# Altium footprint library Cty1.PcbLib: 870 footprints (part 47 of 55)
Each footprint in its own frame and in the unit in brackets; x right, y up, seen from the top. Pads: shape width x height; smd on the part's side, far side on the other; paste and mask are expansions set on the pad; w line width, h text height; cw(c..) or ccw(c..) is an arc to the next point about the centre after c.
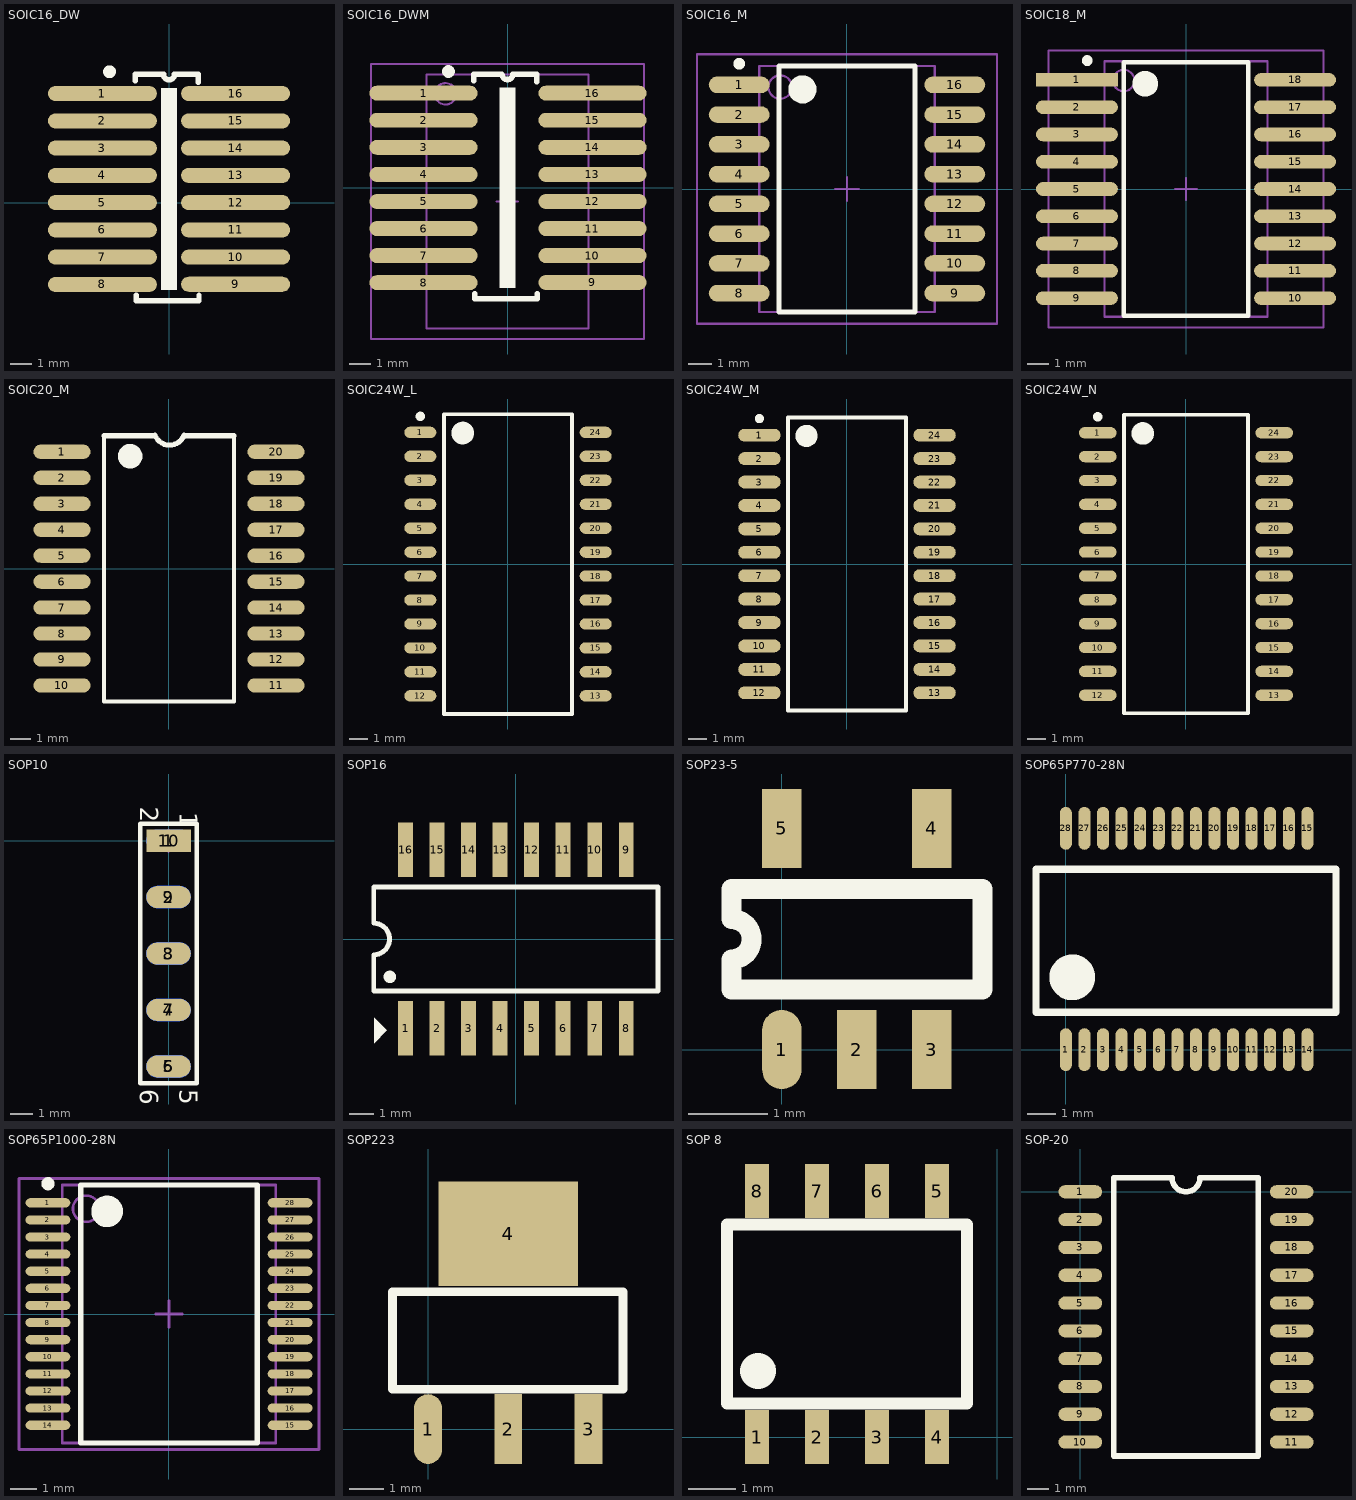
[diagram p46: the footprints below, top view; thin cyan lines are the x and y axes]

## SOIC16_DW [mm] "SOIC, 16-Leads, Body 10x3.8mm, Pitch 1.27mm"
height 2.65
pads (16):
  oval 5.08x0.7 smd: 1(-3.1,5.08) 2(-3.1,3.81) 3(-3.1,2.54) 4(-3.1,1.27) 5(-3.1,0) 6(-3.1,-1.27) 7(-3.1,-2.54) 8(-3.1,-3.81) 9(3.1,-3.8) 10(3.1,-2.54) 11(3.1,-1.27) 12(3.1,0) 13(3.1,1.27) 14(3.1,2.54) 15(3.1,3.81) 16(3.1,5.08)
Top Overlay:
  circle w0.4: c-2.767,6.096 r0.1
  rectangle: -0.381,-4.064 0.381,5.334
  lines w0.254: -1.575,5.664 -1.575,5.969 -0.254,5.969 ccw(c0,5.969) 0.254,5.969 1.372,5.969 1.372,5.613 ; -1.524,-4.318 -1.524,-4.572 1.397,-4.572 1.397,-4.318

## SOIC16_DWM [mm] "SOIC, 16-Leads, Body 10x3.8mm, Pitch 0.3inc"
height 2.65
pads (16):
  oval 5.08x0.7 smd: 1(-3.963,4.445) 2(-3.963,3.175) 3(-3.963,1.905) 4(-3.963,0.635) 5(-3.963,-0.635) 6(-3.963,-1.905) 7(-3.963,-3.175) 8(-3.963,-4.445) 9(3.963,-4.435) 10(3.963,-3.175) 11(3.963,-1.905) 12(3.963,-0.635) 13(3.963,0.635) 14(3.963,1.905) 15(3.963,3.175) 16(3.963,4.445)
Top Overlay:
  circle w0.4: c-2.793,5.461 r0.1
  rectangle: -0.407,-4.699 0.355,4.699
  lines w0.254: -1.601,5.029 -1.601,5.334 -0.28,5.334 ccw(c-0.026,5.334) 0.228,5.334 1.346,5.334 1.346,4.978 ; -1.55,-4.953 -1.55,-5.207 1.371,-5.207 1.371,-4.953
Mechanical 13:
  circle w0.1: c-2.926,4.415 r0.5
  lines w0.1: -3.826,-6.585 -3.826,5.315 3.774,5.315 3.774,-6.585 -3.826,-6.585
Mechanical 15:
  lines w0.1: -0.526,-0.635 0.474,-0.635 ; -0.026,-1.135 -0.026,-0.135 ; -6.426,-7.085 -6.426,5.815 6.374,5.815 6.374,-7.085 -6.426,-7.085
3D body: height 2.65, standoff 0, extent -3.826,-6.585 3.774,5.315

## SOIC16_M [mm] "16-Pin Small Outline Integrated Circuit Package (SOIC16), IPC Low Density"
height 2.65
pads (16):
  oval 2.6x0.7 smd: 1(-4.6,4.445) 2(-4.6,3.175) 3(-4.6,1.905) 4(-4.6,0.635) 5(-4.6,-0.635) 6(-4.6,-1.905) 7(-4.6,-3.175) 8(-4.6,-4.445) 9(4.6,-4.445) 10(4.6,-3.175) 11(4.6,-1.905) 12(4.6,-0.635) 13(4.6,0.635) 14(4.6,1.905) 15(4.6,3.175) 16(4.6,4.445)
Top Overlay:
  circle w0.6: c-1.9,4.25 r0.3
  circle w0.25: c-4.6,5.345 r0.125
  lines w0.2: -2.9,-5.25 2.9,-5.25 2.9,5.25 -2.9,5.25 -2.9,-5.25
Mechanical 13:
  circle w0.1: c-2.85,4.35 r0.5
  lines w0.1: -3.75,-5.25 3.75,-5.25 3.75,5.25 -3.75,5.25 -3.75,-5.25
Mechanical 15:
  lines w0.1: -0.5,0 0.5,0 ; 0,-0.5 0,0.5 ; -6.4,-5.75 6.4,-5.75 6.4,5.75 -6.4,5.75 -6.4,-5.75
3D body: height 2.65, standoff 0, extent -3.75,-5.25 3.75,5.25

## SOIC18_M [mil] "SOIC, 18-Leads, Body 11.6x7.5mm, Pitch 1.27mm, IPC Low Density"
height 104.33
pads (18):
  rect 150x25 smd: 1(-200,200)
  oval 150x25 smd: 2(-200,150) 3(-200,100) 4(-200,50) 5(-200,0) 6(-200,-50) 7(-200,-100) 8(-200,-150) 9(-200,-200) 10(200,-200) 11(200,-150) 12(200,-100) 13(200,-50) 14(200,0) 15(200,50) 16(200,100) 17(200,150) 18(200,200)
Top Overlay:
  circle w23.62: c-74.8,192.91 r11.81
  circle w9.84: c-181.1,235.43 r4.92
  lines w7.87: -114.17,-232.28 114.17,-232.28 114.17,232.28 -114.17,232.28 -114.17,-232.28
Mechanical 13:
  circle w3.94: c-114.17,198.82 r19.68
  lines w3.94: -149.61,-234.25 149.61,-234.25 149.61,234.25 -149.61,234.25 -149.61,-234.25
Mechanical 15:
  lines w3.94: -19.68,0 19.69,0 ; 0,-19.68 0,19.68 ; -251.97,-253.94 251.97,-253.94 251.97,253.94 -251.97,253.94 -251.97,-253.94

## SOIC20_M [mm] "20-Pin Small Outline Integrated Circuit 1.27 mm Pitch, IPC Low Density"
height 2.65
pads (20):
  oval 2.794x0.7 smd: 1(-5.235,5.715) 2(-5.235,4.445) 3(-5.235,3.175) 4(-5.235,1.905) 5(-5.235,0.635) 6(-5.235,-0.635) 7(-5.235,-1.905) 8(-5.235,-3.175) 9(-5.235,-4.445) 10(-5.235,-5.715) 11(5.235,-5.715) 12(5.235,-4.445) 13(5.235,-3.175) 14(5.235,-1.905) 15(5.235,-0.635) 16(5.235,0.635) 17(5.235,1.905) 18(5.235,3.175) 19(5.235,4.445) 20(5.235,5.715)
Top Overlay:
  circle w0.6: c-1.9,5.5 r0.3
  lines w0.2: -3.175,6.5 -3.175,-6.5 3.175,-6.5 3.175,6.5
  lines w0.254: -3.175,6.5 -0.785,6.5 ; -0.692,6.535 ccw(c0.022,6.802) 0.73,6.522 ; 0.785,6.5 3.175,6.5

## SOIC24W_L [mm] "SOIC, 24-Leads, Body 15.4x7.5mm, Pitch 1.27mm, IPC High Density"
height 2.67
pads (24):
  oval 1.7x0.6 smd: 1(-4.65,6.985) 2(-4.65,5.715) 3(-4.65,4.445) 4(-4.65,3.175) 5(-4.65,1.905) 6(-4.65,0.635) 7(-4.65,-0.635) 8(-4.65,-1.905) 9(-4.65,-3.175) 10(-4.65,-4.445) 11(-4.65,-5.715) 12(-4.65,-6.985) 13(4.65,-6.985) 14(4.65,-5.715) 15(4.65,-4.445) 16(4.65,-3.175) 17(4.65,-1.905) 18(4.65,-0.635) 19(4.65,0.635) 20(4.65,1.905) 21(4.65,3.175) 22(4.65,4.445) 23(4.65,5.715) 24(4.65,6.985)
Top Overlay:
  circle w0.6: c-2.4,6.95 r0.3
  circle w0.25: c-4.65,7.835 r0.125
  lines w0.2: -3.4,-7.95 3.4,-7.95 3.4,7.95 -3.4,7.95 -3.4,-7.95

## SOIC24W_M [mm] "SOIC, 24-Leads, Body 15.4x7.5mm, Pitch 1.27mm, IPC Low Density"
height 2.67
pads (24):
  oval 2.3x0.7 smd: 1(-4.75,6.985) 2(-4.75,5.715) 3(-4.75,4.445) 4(-4.75,3.175) 5(-4.75,1.905) 6(-4.75,0.635) 7(-4.75,-0.635) 8(-4.75,-1.905) 9(-4.75,-3.175) 10(-4.75,-4.445) 11(-4.75,-5.715) 12(-4.75,-6.985) 13(4.75,-6.985) 14(4.75,-5.715) 15(4.75,-4.445) 16(4.75,-3.175) 17(4.75,-1.905) 18(4.75,-0.635) 19(4.75,0.635) 20(4.75,1.905) 21(4.75,3.175) 22(4.75,4.445) 23(4.75,5.715) 24(4.75,6.985)
Top Overlay:
  circle w0.25: c-4.75,7.885 r0.125
  circle w0.6: c-2.2,6.95 r0.3
  lines w0.2: -3.2,-7.95 -3.2,7.95 3.2,7.95 3.2,-7.95 -3.2,-7.95

## SOIC24W_N [mm] "SOIC, 24-Leads, Body 15.4x7.5mm, Pitch 1.27mm, IPC Medium Density"
height 2.67
pads (24):
  oval 2x0.6 smd: 1(-4.7,6.985) 2(-4.7,5.715) 3(-4.7,4.445) 4(-4.7,3.175) 5(-4.7,1.905) 6(-4.7,0.635) 7(-4.7,-0.635) 8(-4.7,-1.905) 9(-4.7,-3.175) 10(-4.7,-4.445) 11(-4.7,-5.715) 12(-4.7,-6.985) 13(4.7,-6.985) 14(4.7,-5.715) 15(4.7,-4.445) 16(4.7,-3.175) 17(4.7,-1.905) 18(4.7,-0.635) 19(4.7,0.635) 20(4.7,1.905) 21(4.7,3.175) 22(4.7,4.445) 23(4.7,5.715) 24(4.7,6.985)
Top Overlay:
  circle w0.6: c-2.3,6.95 r0.3
  circle w0.25: c-4.7,7.835 r0.125
  lines w0.2: -3.3,-7.95 3.3,-7.95 3.3,7.95 -3.3,7.95 -3.3,-7.95

## SOP10 [mm] "SOIC 10 hai lop"
height 2.54
pads (10):
  rect 2x1 smd: 1(0,0)
  oval 2x1 smd: 2(0,-2.54) 3(0,-5.08) 4(0,-7.62) 5(0,-10.16)
  oval 2x1 smd far side: 6(0,-10.16) 7(0,-7.62) 8(0,-5.08) 9(0,-2.54) 10(0,0)
Top Overlay:
  lines w0.2: -1.27,0 -1.27,0.762 1.27,0.762 1.27,0 ; -1.27,0.086 -1.27,-10.414 -1.27,-10.922 1.27,-10.922 1.27,-10.414 1.27,0.086
  text "1" at 0.508,1.27 h0.8
  text "2" at -1.27,1.524 h0.8
  text "5" at 0.508,-11.176 h0.8
  text "6" at -1.27,-11.176 h0.8
Mechanical 15:
  lines w0.1: -0.5,0 0.5,0 ; 0,-0.5 0,0.5

## SOP16 [mm] "Small Outline; 16 Leads; Body Width 5.6 mm; Pitch 1.27 mm"
height 2
pads (16):
  rect 0.6x2.2 smd: 1(-4.445,-3.6) 2(-3.175,-3.6) 3(-1.905,-3.6) 4(-0.635,-3.6) 5(0.635,-3.6) 6(1.905,-3.6) 7(3.175,-3.6) 8(4.445,-3.6) 9(4.445,3.6) 10(3.175,3.6) 11(1.905,3.6) 12(0.635,3.6) 13(-0.635,3.6) 14(-1.905,3.6) 15(-3.175,3.6) 16(-4.445,3.6)
Top Overlay:
  circle w0.25: c-5.078,-1.524 r0.125
  region: -5.715,-4.191 -5.207,-3.683 -5.715,-3.175
  lines w0.2: -5.725,-2.1 5.725,-2.1 5.725,2.1 -5.725,2.1 -5.725,0.635 cw(c-5.725,0) -5.725,-0.635 -5.725,-2.1

## SOP23-5 [mm]
pads (5):
  oval 0.5x1 smd: 1(0,0)
  rect 0.5x1 smd: 2(0.95,0) 3(1.9,0) 4(1.9,2.8) 5(0,2.8)
Top Overlay:
  lines w0.254: -0.635,0.762 -0.635,1.143 ccw(c-0.635,1.397) -0.635,1.651 -0.635,2.032 2.54,2.032 2.54,0.762 -0.635,0.762

## SOP65P770-28N [mil]
pads (28):
  oval 16.53x59.03 smd mask+7.9: 1(0,0) 2(25.6,0) 3(51.18,0) 4(76.78,0) 5(102.37,0) 6(127.97,0) 7(153.57,0) 8(179.15,0) 9(204.75,0) 10(230.35,0) 11(255.93,0) 12(281.53,0) 13(307.12,0) 14(332.7,0) 15(332.7,305) 16(307.12,305) 17(281.53,305) 18(255.93,305) 19(230.35,305) 20(204.75,305) 21(179.15,305) 22(153.57,305) 23(127.97,305) 24(102.37,305) 25(76.78,305) 26(51.18,305) 27(25.6,305) 28(0,305)
Top Overlay:
  circle w39.37: c8.8,99.7 r11.88
  lines w10: -41.22,51.66 372.21,51.66 372.21,248.53 -41.22,248.53 -41.22,51.66
3D body "SOP65P770x200-28N.step": height 84.65, standoff 0, extent -37.01,0.01 369.69,305.35

## SOP65P1000-28N [mm] "SOP, 28-Leads, Body 9.7x8mm, Pitch 0.65mm, IPC Medium Density"
height 2
pads (28):
  oval 1.7x0.35 smd: 1(-4.6,4.225) 2(-4.6,3.575) 3(-4.6,2.925) 4(-4.6,2.275) 5(-4.6,1.625) 6(-4.6,0.975) 7(-4.6,0.325) 8(-4.6,-0.325) 9(-4.6,-0.975) 10(-4.6,-1.625) 11(-4.6,-2.275) 12(-4.6,-2.925) 13(-4.6,-3.575) 14(-4.6,-4.225) 15(4.6,-4.225) 16(4.6,-3.575) 17(4.6,-2.925) 18(4.6,-2.275) 19(4.6,-1.625) 20(4.6,-0.975) 21(4.6,-0.325) 22(4.6,0.325) 23(4.6,0.975) 24(4.6,1.625) 25(4.6,2.275) 26(4.6,2.925) 27(4.6,3.575) 28(4.6,4.225)
Top Overlay:
  circle w0.25: c-4.6,4.95 r0.125
  circle w0.6: c-2.35,3.9 r0.3
  lines w0.2: -3.35,-4.9 -3.35,4.9 3.35,4.9 3.35,-4.9 -3.35,-4.9
Mechanical 13:
  circle w0.1: c-3.15,4 r0.5
  lines w0.1: -4.05,-4.9 -4.05,4.9 4.05,4.9 4.05,-4.9 -4.05,-4.9
Mechanical 15:
  lines w0.1: -0.5,0 0.5,0 ; 0,-0.5 0,0.5 ; -5.7,-5.15 -5.7,5.15 5.7,5.15 5.7,-5.15 -5.7,-5.15
3D body: height 2, standoff 0, extent -4.05,-4.9 4.05,4.9

## SOP223 [mm]
pads (4):
  oval 0.8x2 smd: 1(0,0)
  rect 0.8x2 smd: 2(2.3,0) 3(4.6,0)
  rect 4x3 smd: 4(2.3,5.6)
Top Overlay:
  lines w0.254: -1.016,1.143 -1.016,3.937 5.588,3.937 5.588,1.143 -1.016,1.143

## SOP 8 [mil]
pads (8):
  rect 20x45 smd: 1(-200,0) 2(-150,0) 3(-100,0) 4(-50,0) 5(-50,205) 6(-100,205) 7(-150,205) 8(-200,205)
Top Overlay:
  lines w10: -225,28 -25,28 -25,177 -225,177 -225,28
  lines w30: -199.03,55.09 cw(c-203.05,53.75) -199,55

## SOP-20 [mm]
pads (20):
  oval 2x0.6 smd: 1(0,0) 2(0,-1.27) 3(0,-2.54) 4(0,-3.81) 5(0,-5.08) 6(0,-6.35) 7(0,-7.62) 8(0,-8.89) 9(0,-10.16) 10(0,-11.43) 11(9.652,-11.43) 12(9.652,-10.16) 13(9.652,-8.89) 14(9.652,-7.62) 15(9.652,-6.35) 16(9.652,-5.08) 17(9.652,-3.81) 18(9.652,-2.54) 19(9.652,-1.27) 20(9.652,0)
Top Overlay:
  lines w0.254: 1.524,-12.065 8.128,-12.065 8.128,0.635 5.461,0.635 cw(c4.826,0.635) 4.191,0.635 1.524,0.635 1.524,-12.065